# Altium footprint library Footprints_SOC.PcbLib: 182 footprints (part 7 of 12)
Each footprint in its own frame and in the unit in brackets; x right, y up, seen from the top. Pads: shape width x height; smd on the part's side, far side on the other; paste and mask are expansions set on the pad; w line width, h text height; cw(c..) or ccw(c..) is an arc to the next point about the centre after c.
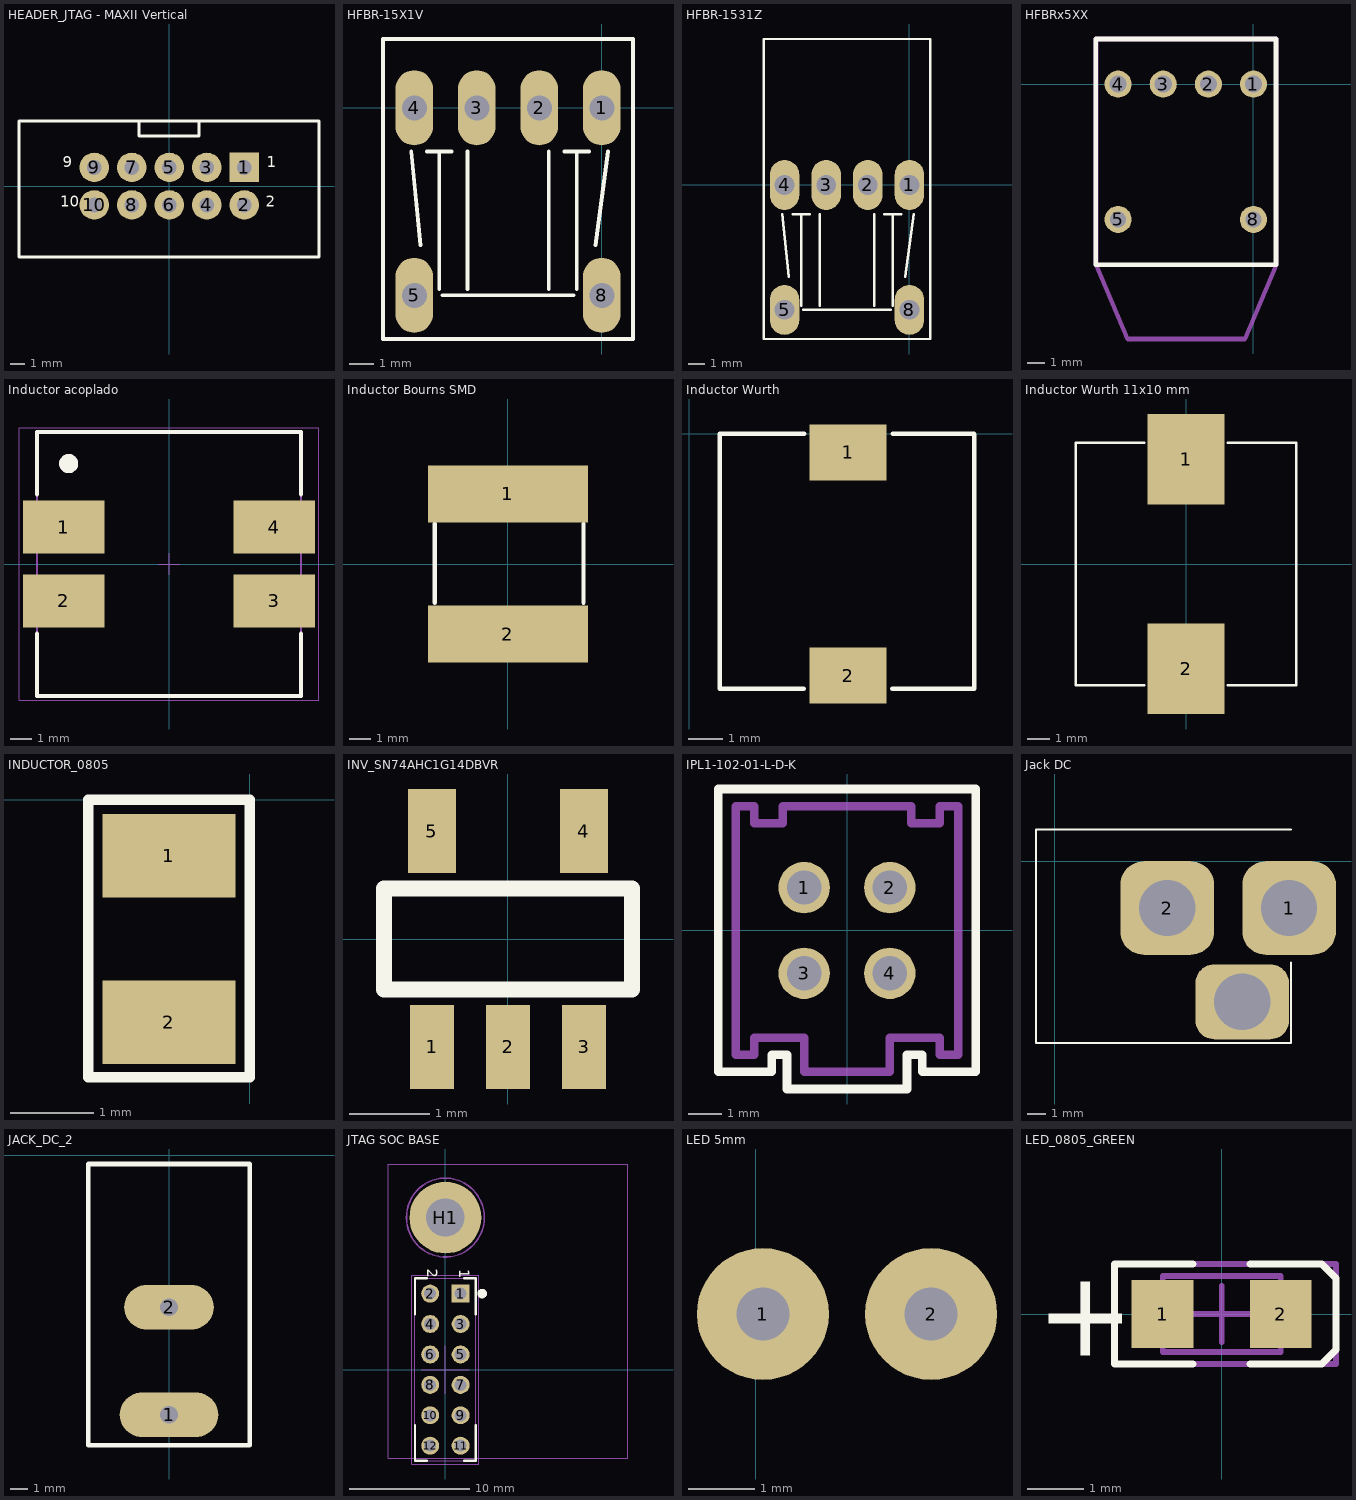
[diagram p6: the footprints below, top view; thin cyan lines are the x and y axes]

## HEADER_JTAG - MAXII Vertical [mm] "Connector; Header; 5x2 Position"
pads (10):
  rect 2x2 hole 1: 1(5.08,1.27)
  round 2 hole 1: 2(5.08,-1.27) 3(2.54,1.27) 4(2.54,-1.27) 5(0,1.27) 6(0,-1.27) 7(-2.54,1.27) 8(-2.54,-1.27) 9(-5.08,1.27) 10(-5.08,-1.27)
Top Overlay:
  lines w0.2: -2.05,4.417 -2.05,3.4 2.014,3.4 2.014,4.417 ; -10.178,-4.801 10.142,-4.801 10.142,4.417 -10.178,4.417 -10.178,-4.801
  text "2" at 6.52,-1.67 h1.27
  text "1" at 6.62,1.007 h1.27
  text "9" at -7.2,1 h1.27
  text "10" at -7.38,-1.67 h1.27
3D body "Header JTAG CPLD MAXII Vertical.STEP": height 9.41, standoff -2.8, extent -10.178,-4.801 10.142,4.417

## HFBR-15X1V [mil] "Transmisor fibra Optica Horizontal"
pads (6):
  oval 60x120 hole 40: 1(0,0) 2(-100,0) 3(-200,0) 4(-300,0) 5(-300,-300) 8(0,-300)
Top Overlay:
  lines w6: -305,-70 -290,-220 ; -280,-70 -260,-70 ; -260,-290 -260,-70 ; -255,-300 -45,-300 ; -240,-70 -260,-70 ; -215,-290 -215,-70 ; -85,-290 -85,-70 ; -60,-70 -40,-70 ; -40,-290 -40,-70 ; -20,-70 -40,-70 ; -10,-220 10,-70 ; -350,-370 -350,-103.33 -350,110 50,110 50,-370 -5,-370 -295,-370 -350,-370
Mechanical 16:
  lines w6: -295,-340 -295,-260 ; -225,30 -215,30 ; -5,-340 -5,-260
3D body "HFBR2521 (Tx Fibra ootica).STEP": height 300, standoff -124.8, extent -350.31,-630.16 130,110

## HFBR-1531Z [mm] "Emisor fibra optica Vertical"
pads (6):
  oval 1.8x3.048 hole 1.2: 1(0,0) 2(-2.54,0) 3(-5.08,0) 4(-7.62,0) 5(-7.62,-7.62) 8(0,-7.62)
Top Overlay:
  lines w0.152: -7.747,-1.778 -7.366,-5.588 ; -7.112,-1.778 -6.604,-1.778 ; -6.604,-7.366 -6.604,-1.778 ; -6.477,-7.62 -1.143,-7.62 ; -6.096,-1.778 -6.604,-1.778 ; -5.461,-7.366 -5.461,-1.778 ; -2.159,-7.366 -2.159,-1.778 ; -1.524,-1.778 -1.016,-1.778 ; -1.016,-7.366 -1.016,-1.778 ; -0.508,-1.778 -1.016,-1.778 ; -0.254,-5.588 0.254,-1.778 ; -8.89,-9.398 -7.493,-9.398 -0.127,-9.398 1.27,-9.398 1.27,8.9 -8.89,8.9 -8.89,-2.625 -8.89,-9.398
Mechanical 16:
  lines w0.152: -7.493,-8.636 -7.493,-6.604 ; -5.715,0.762 -5.461,0.762 ; -0.127,-8.636 -0.127,-6.604
3D body "HFBR-0500Z Series (Tx Fibr optica Vertical).stp": height 18.8, standoff -3.3, extent -8.988,-9.45 3.202,8.84

## HFBRx5XX [mil]
pads (6):
  round 60 hole 38: 1(0,0) 2(-100,0) 3(-200,0) 4(-300,0)
  round 60 hole 35: 5(-300,-300) 8(0,-300)
Top Overlay:
  lines w10: -350,-400 -350,100 50,100 50,-400 -350,-400
Mechanical 5:
  lines w10: -349,-400 -349,100 51,100 51,-400 -19,-565 -279,-565 -349,-400
  text ".Designator" at -352,-201 h40
3D body "Avago HFBR-0500ETZ Series.stp": height 343.94, standoff -100.16, extent -349.96,-610 129.96,130.12

## Inductor acoplado [mm] "P/N: 744874002 SMT Shielded Coupled Inductor, 4-Leads, body 12.5x12.5mm"
height 8.5
pads (4):
  rect 3.85x2.5 smd: 1(-4.975,1.75) 2(-4.975,-1.75) 3(4.975,-1.75) 4(4.975,1.75)
Top Overlay:
  circle w0.5: c-4.75,4.75 r0.2
  lines w0.2: -6.25,-3.3 -6.25,-6.25 6.25,-6.25 6.25,-3.3 ; -6.25,3.3 -6.25,6.25 6.25,6.25 6.25,3.3
Mechanical 13:
  circle w0.5: c-4.75,4.75 r0.2
  lines w0.1: -6.25,-6.25 6.25,-6.25 6.25,6.25 -6.25,6.25 -6.25,-6.25
Mechanical 15:
  lines w0.05: -0.5,0 0.5,0 ; 0,-0.5 0,0.5 ; -7.1,-6.45 7.1,-6.45 7.1,6.45 -7.1,6.45 -7.1,-6.45
3D body "STEP-WE-DD-1280_CROSSED-rev1.stp": height 8.62, standoff 0.02, extent -6.25,-6.25 6.25,6.25

## Inductor Bourns SMD [mm] "6.8x6.8mm P/N: SRR6038-120Y"
height 4
pads (2):
  rect 7.3x2.6 smd: 1(0,3.2) 2(0,-3.2)
Top Overlay:
  lines w0.2: -3.35,-1.77 -3.35,1.83 ; 3.45,-1.77 3.45,1.83
3D body "Inductor Bourns SMD SRR6038-120Y .stp": height 3.9, standoff 0.1, extent -3.35,-3.27 3.45,3.53

## Inductor Wurth [mm] "SMD Inductor"
pads (2):
  rect 2.2x1.6 smd: 1(4.55,-0.53) 2(4.55,-6.93)
Top Overlay:
  lines w0.127: 3.28,-7.3 0.87,-7.3 0.87,0 3.29,0 ; 5.82,-7.3 8.17,-7.3 8.17,-0.01 ; 5.83,0 8.16,0
3D body "bobina wurth.stp": height 4.55, standoff 0.05, extent 0.87,-7.3 8.17,0

## Inductor Wurth 11x10 mm [mm] "SMD Inductor P/N:74437368100"
pads (2):
  rect 3.5x4.1 smd: 1(0,4.75) 2(0,-4.75)
Top Overlay:
  lines w0.127: -1.9,-5.5 -5,-5.5 -5,5.5 -1.9,5.5 ; 1.9,-5.5 5,-5.5 5,5.5 1.9,5.5
3D body "Inductor Wurth SMD 11x10mm (WE-LHMI-1040-rev1).stp": height 3.8, standoff 0, extent -5,-5.5 5,5.5

## INDUCTOR_0805 [mm] "Wurth"
pads (2):
  rect 1.6x1 smd: 1(-0.97,-0.67) 2(-0.97,-2.67)
Top Overlay:
  lines w0.127: -1.94,-3.33 -1.94,0 0,0 0,-3.33 -1.94,-3.33
3D body "inductor 0805 wurth.stp": height 1, standoff 0, extent -1.57,-2.67 -0.37,-0.67

## INV_SN74AHC1G14DBVR [mm] "IC SCHMITT-TRG INV GATE SOT23-5"
height 1.45
pads (5):
  rect 0.55x1.05 smd mask+0.07: 1(-0.95,-1.35) 2(0,-1.35) 3(0.95,-1.35)
  rect 0.6x1.05 smd mask+0.1: 4(0.95,1.35) 5(-0.95,1.35)
Top Overlay:
  lines w0.2: -1.55,-0.63 -1.55,0.63 1.55,0.63 1.55,-0.63 -1.55,-0.63
3D body "SOT23-5.stp": height 1.2, standoff 0.02, extent -1.5,-1.418 1.5,1.418

## IPL1-102-01-L-D-K [mil]
pads (4):
  round 60 hole 40 mask+3: 1(-50,50) 2(50,50) 3(-50,-50) 4(50,-50)
Top Overlay:
  lines w10: -95,165 95,165 ; -88,165 -150,165 -150,-165 -88,-165 -88,-145 -70,-145 -70,-185 70,-185 70,-145 88,-145 88,-165 150,-165 150,165 88,165
Mechanical 5:
  lines w10: -130,-145 -108,-145 -108,-125 -50,-125 -50,-165 50,-165 50,-125 108,-125 108,-145 130,-145 130,145 108,145 108,125 75,125 75,145 -75,145 -75,125 -108,125 -108,145 -130,145 -130,-145
  text ".Designator" at -19.68,-19.68 h30
3D body "IPL1-102-01-F-D-K.stp": height 320, standoff -120, extent -130,-165 130,145

## Jack DC [mm]
pads (3):
  rrect50% 5x5 hole 3: 1(12.5,-2.5) 2(6,-2.5)
  rrect50% 5x4 hole 3: ""(10,-7.5)
Top Overlay:
  lines w0.1: 12.6,-5.4 12.6,-9.7 -1,-9.7 -1,1.7 12.6,1.7
3D body "Jack DC_10A_Hembra.step": height 11.3, standoff -3.2, extent -1,-7.9 13.1,1.7

## JACK_DC_2 [mm] "Conector alimentacion externa"
pads (2):
  oval 5.5x2.5 hole 1 square: 1(0,-14.5)
  oval 5x2.5 hole 1 square: 2(0,-8.5)
Top Overlay:
  lines w0.254: -4.5,-16.2 -4.5,-0.5 4.5,-0.5 4.5,-16.2 -4.5,-16.2
3D body "Jack DC CUI 5A 2 Terminales.step": height 11, standoff -3.5, extent -4.45,-15.22 4.55,-0.72

## JTAG SOC BASE [mm]
height 15
pads (13):
  rect 1.5x1.5 hole 1: 1(1.27,6.35)
  round 1.5 hole 1: 2(-1.27,6.35) 3(1.27,3.81) 4(-1.27,3.81) 5(1.27,1.27) 6(-1.27,1.27) 7(1.27,-1.27) 8(-1.27,-1.27) 9(1.27,-3.81) 10(-1.27,-3.81) 11(1.27,-6.35) 12(-1.27,-6.35)
  round 6 hole 3.2: H1(0,12.7)
Top Overlay:
  circle w0.4: c3.07,6.35 r0.2
  lines w0.2: -2.54,-4.62 -2.54,-7.62 -1.56,-7.62 ; -2.54,4.62 -2.54,7.62 -1.56,7.62 ; 1.56,-7.62 2.54,-7.62 2.54,-4.62 ; 1.56,7.62 2.54,7.62 2.54,4.62
  text "1" at 0.88,8.4 h1.52
  text "2" at -1.8,8.44 h1.52
Mechanical 11:
  lines w0.1: -4.78,-7.38 15.24,-7.38 15.24,17.174 -4.78,17.174 -4.78,-7.38
Mechanical 13:
  circle w0.1: c0,12.7 r1.6
  circle w0.1: c0,12.7 r3.25
  lines w0.1: -2.54,-7.62 2.54,-7.62 2.54,7.62 -2.54,7.62 -2.54,-7.62
  text "11" at 1,-5.23 h1
  text "12" at -2,-5.23 h1
  text "2" at -2,6.73 h1
  text "1" at 1,6.73 h1
  text ".Designator" at -1.45,-0.525 h1
Mechanical 14:
  circle w0.1: c0,12.7 r3.25
  circle w0.1: c0,12.7 r1.6
Mechanical 15:
  circle w0.05: c0,12.7 r3.3
  lines w0.05: -2,0 2,0 ; -1,12.7 1,12.7 ; 0,-2 0,2 ; 0,11.7 0,13.7 ; -2.8,-7.88 2.8,-7.88 2.8,7.88 -2.8,7.88 -2.8,-7.88
Mechanical 16:
  circle w0.05: c0,12.7 r3.3
3D body "female_header_a-bl254-dg-g12d.stp": height 8.5, standoff -3.2, extent -2.5,-7.745 2.5,7.745
3D body "TE0790-01.step": height 14.23, standoff 2.57, extent -4.78,-7.62 15.24,18.697

## LED 5mm [mm]
pads (2):
  round 2 hole 0.8: 1(0.11,-2.71) 2(2.66,-2.71)
3D body "Led verde 5mm.step": height 3.5, standoff 0.01, extent -0.643,-3.135 3.343,5.425

## LED_0805_GREEN [mm] "Chip LED, 2-Leads, Body 2.0x1.3mm, IPC Medium Density"
height 0.8
pads (2):
  rect 1.1x1.2 smd: 1(-1.05,0) 2(1.05,0)
Top Overlay:
  lines w0.127: -0.508,-0.889 -1.905,-0.889 -1.905,0.889 -0.508,0.889 ; 0.508,-0.889 1.778,-0.889 2.032,-0.635 2.032,0.635 1.778,0.889 0.508,0.889
  text "+" at -3.3,-0.74 h1.52
Mechanical 13:
  lines w0.1: -1.05,-0.675 -1.05,0.675 1.05,0.675 1.05,-0.675 -1.05,-0.675
Mechanical 15:
  lines w0.1: -0.5,0 0.5,0 ; 0,-0.5 0,0.5 ; -1.905,-0.889 -1.905,0.889 2.032,0.889 2.032,-0.889 -1.905,-0.889
3D body "WL-SMCW_0805_LED.stp": height 0.68, standoff -0.02, extent -1,-0.625 1,0.625